# Altium footprint library Components.PcbLib: 260 footprints (part 15 of 17)
Each footprint in its own frame and in the unit in brackets; x right, y up, seen from the top. Pads: shape width x height; smd on the part's side, far side on the other; paste and mask are expansions set on the pad; w line width, h text height; cw(c..) or ccw(c..) is an arc to the next point about the centre after c.
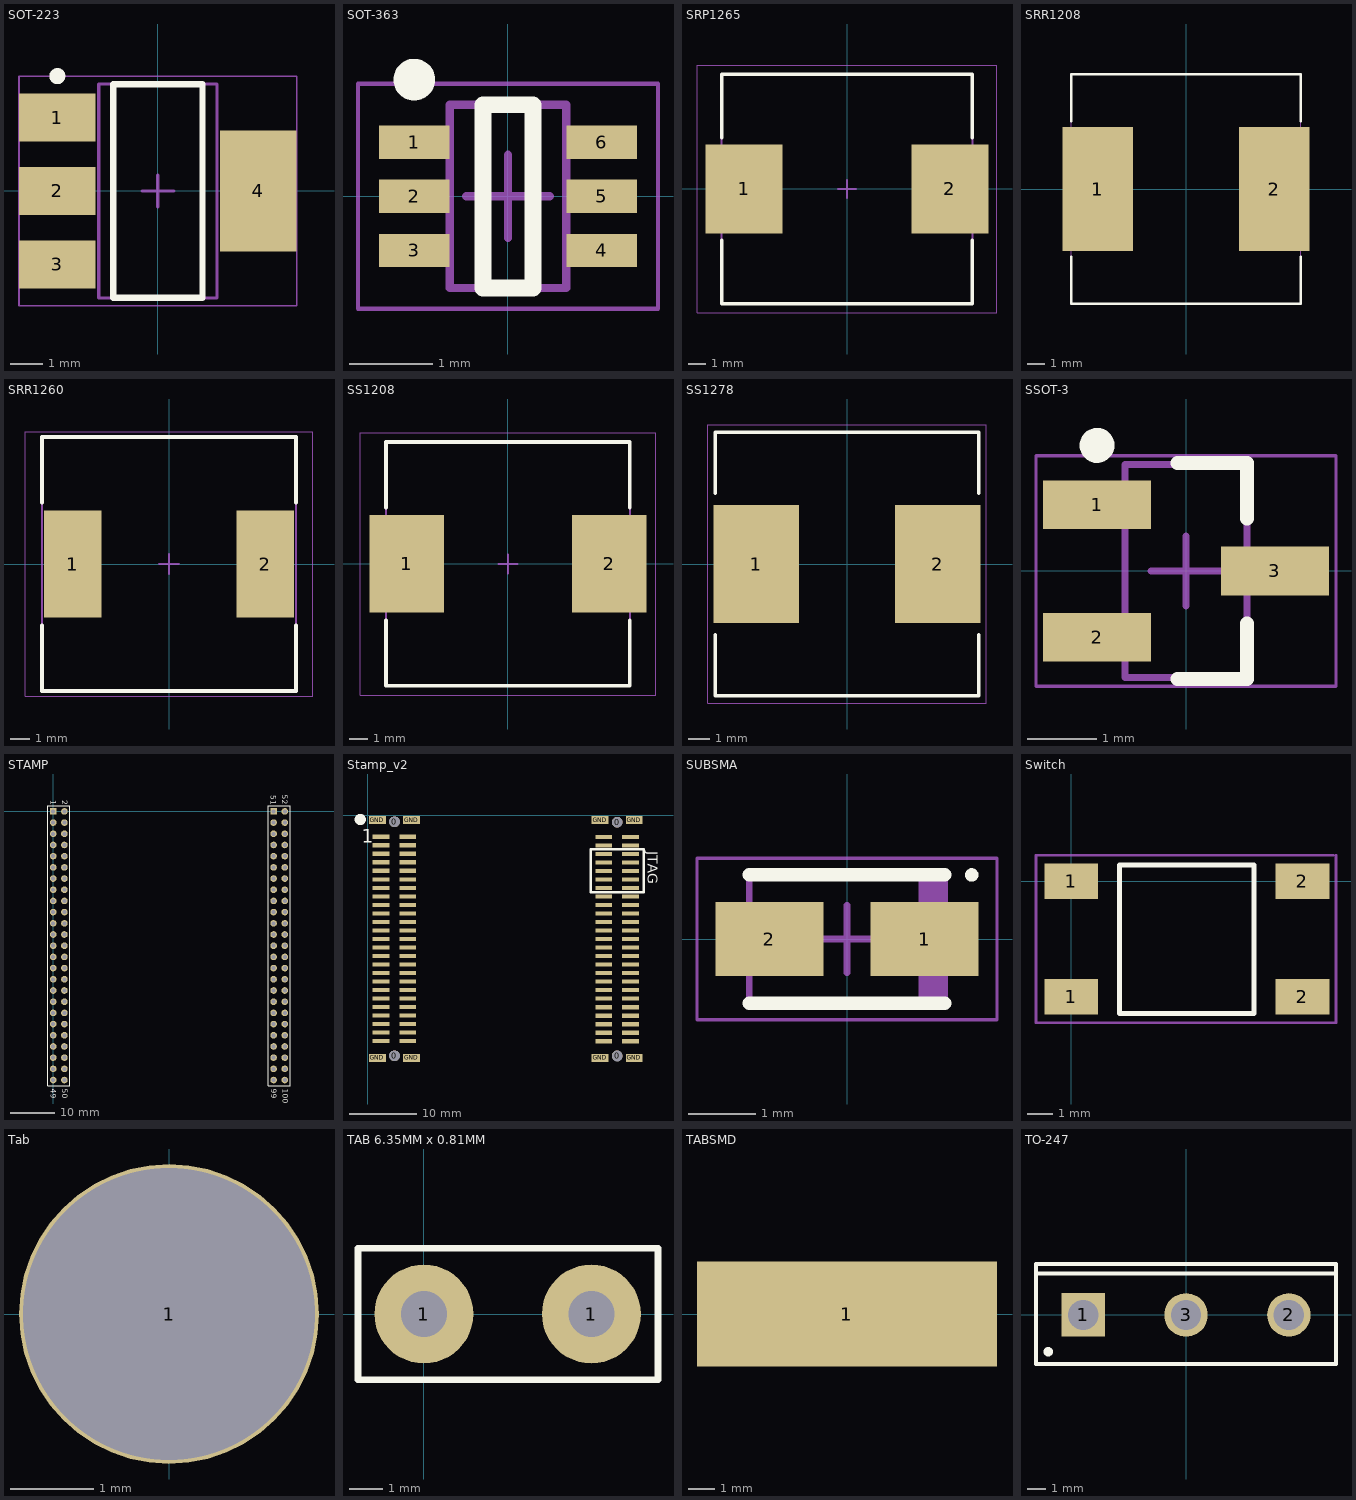
[diagram p14: the footprints below, top view; thin cyan lines are the x and y axes]

## SOT-223 [mm] "SOT223, 4-Leads, Body 6,50x7,00mm (avg), Pitch 2,30mm, IPC Medium Density"
height 1.8
pads (4):
  rect 2.4x1.5 smd: 1(-3.15,2.3) 2(-3.15,0) 3(-3.15,-2.3)
  rect 2.4x3.8 smd: 4(3.15,0)
Top Overlay:
  circle w0.25: c-3.15,3.6 r0.125
  lines w0.2: -1.4,-3.35 -1.4,3.35 1.4,3.35 1.4,-3.35 -1.4,-3.35
Mechanical 13:
  lines w0.1: -1.85,-3.35 -1.85,3.35 1.85,3.35 1.85,-3.35 -1.85,-3.35
Mechanical 15:
  lines w0.05: -4.35,-3.6 -4.35,3.6 4.35,3.6 4.35,-3.6 -4.35,-3.6
  lines w0.1: -0.5,0 0.5,0 ; 0,-0.5 0,0.5
3D body: height 1.8, standoff 0.02, extent -1.85,-3.35 1.85,3.35

## SOT-363 [mm]
height 1.1
pads (6):
  rect 0.85x0.4 smd: 1(-1.125,0.65) 2(-1.125,0) 3(-1.125,-0.65) 4(1.125,-0.65) 5(1.125,0) 6(1.125,0.65)
Top Overlay:
  circle w0.25: c-1.125,1.4 r0.125
  lines w0.2: -0.3,-1.1 -0.3,1.1 0.3,1.1 0.3,-1.1 -0.3,-1.1
Mechanical 13:
  lines w0.1: -0.7,-1.1 -0.7,1.1 0.7,1.1 0.7,-1.1 -0.7,-1.1
Mechanical 15:
  lines w0.05: -1.8,-1.35 -1.8,1.35 1.8,1.35 1.8,-1.35 -1.8,-1.35
  lines w0.1: -0.5,0 0.5,0 ; 0,-0.5 0,0.5
3D body "SOT-363.step": height 1.1, standoff 0, extent -1.2,-1.1 1.2,1.1

## SRP1265 [mm] "Precision Wire Wound Inductor, 2-Leads, Body 13,50x12,50mm, IPC Low Density"
height 6.4
pads (2):
  rect 4.3x4.95 smd: 1(-5.75,0) 2(5.75,0)
Top Overlay:
  lines w0.2: -7,-2.875 -7,-6.4 7,-6.4 7,-2.875 ; -7,2.875 -7,6.4 7,6.4 7,2.875
Mechanical 13:
  lines w0.1: -7,-6.4 7,-6.4 7,6.4 -7,6.4 -7,-6.4
Mechanical 15:
  lines w0.05: -8.375,-6.9 8.375,-6.9 8.375,6.9 -8.375,6.9 -8.375,-6.9
  lines w0.1: -0.5,0 0.5,0 ; 0,-0.5 0,0.5
3D body "L_1265.STEP": height 6.7, standoff 0, extent -6.275,-6.25 6.225,6.25

## SRR1208 [mil]
pads (2):
  rect 157x276 smd: 1(-196.5,0) 2(196.5,0)
Top Overlay:
  lines w6: -256,-151.1 -256,-256 256,-256 256,-151.1 ; -256,151.1 -256,256 256,256 256,151.1
Mechanical 13:
  lines w0: -256,-256 -256,256 256,256 256,-256 -256,-256
3D body "SRR1208.STEP": height 314.96, standoff 0, extent -250,-249.99 250,250.01

## SRR1260 [mm] "Precision Wire Wound Inductor, 2-Leads, Body 12,50x12,50mm, IPC Medium Density"
height 6.5
pads (2):
  rect 2.9x5.4 smd: 1(-4.85,0) 2(4.85,0)
Top Overlay:
  lines w0.2: -6.4,-3.1 -6.4,-6.4 6.4,-6.4 6.4,-3.1 ; -6.4,3.1 -6.4,6.4 6.4,6.4 6.4,3.1
Mechanical 13:
  lines w0.1: -6.4,-6.4 6.4,-6.4 6.4,6.4 -6.4,6.4 -6.4,-6.4
Mechanical 15:
  lines w0.05: -7.225,-6.65 7.225,-6.65 7.225,6.65 -7.225,6.65 -7.225,-6.65
  lines w0.1: -0.5,0 0.5,0 ; 0,-0.5 0,0.5
3D body: height 6.5, standoff 0, extent -6.4,-6.4 6.4,6.4

## SS1208 [mm]
height 8.5
pads (2):
  rect 4x5.2 smd: 1(-5.4,0) 2(5.4,0)
Top Overlay:
  lines w0.2: -6.5,-3 -6.5,-6.5 6.5,-6.5 6.5,-3 ; -6.5,3 -6.5,6.5 6.5,6.5 6.5,3
Mechanical 13:
  lines w0.1: -6.5,-6.5 6.5,-6.5 6.5,6.5 -6.5,6.5 -6.5,-6.5
Mechanical 15:
  lines w0.05: -7.875,-7 7.875,-7 7.875,7 -7.875,7 -7.875,-7
  lines w0.1: -0.5,0 0.5,0 ; 0,-0.5 0,0.5
3D body "SS1208.step": height 8.5, standoff 0.01, extent -6.35,-6.35 6.35,6.35

## SS1278 [mil]
pads (2):
  rect 157x217 smd: 1(-167,0) 2(167,0)
Top Overlay:
  lines w6: -242,-130 -242,-242 242,-242 242,-130 ; -242,130 -242,242 242,242 242,130
Mechanical 13:
  lines w0: -256,-256 256,-256 256,256 -256,256 -256,-256
3D body "SS1278.STEP": height 314.96, standoff 0, extent -242.12,-242.12 242.13,242.13

## SSOT-3 [mm] "SOT23, 3-Leads, Body 2,90x3,60mm, Pitch 0,95mm, IPC High Density"
height 1.45
pads (3):
  rect 1.55x0.7 smd: 1(-1.275,0.95) 2(-1.275,-0.95) 3(1.275,0)
Top Overlay:
  circle w0.25: c-1.275,1.8 r0.125
  lines w0.2: -0.125,-1.55 0.875,-1.55 0.875,-0.75 ; -0.125,1.55 0.875,1.55 0.875,0.75
Mechanical 13:
  lines w0.1: -0.875,-1.525 -0.875,1.525 0.875,1.525 0.875,-1.525 -0.875,-1.525
Mechanical 15:
  lines w0.05: -2.15,-1.65 -2.15,1.65 2.15,1.65 2.15,-1.65 -2.15,-1.65
  lines w0.1: -0.5,0 0.5,0 ; 0,-0.5 0,0.5
3D body "SOT23.STEP": height 1.2, standoff -0.02, extent -1.126,-1.5 1.126,1.5

## STAMP [mm] "2x 2x25 pin, 2.54mm connector"
height 15
pads (100):
  rect 1.5x1.5 hole 0.9: 1(0,0) 51(50.013,0)
  round 1.5 hole 0.9: 2(2.54,0) 3(0,-2.54) 4(2.54,-2.54) 5(0,-5.08) 6(2.54,-5.08) 7(0,-7.62) 8(2.54,-7.62) 9(0,-10.16) 10(2.54,-10.16) 11(0,-12.7) 12(2.54,-12.7) 13(0,-15.24) 14(2.54,-15.24) 15(0,-17.78) 16(2.54,-17.78) 17(0,-20.32) 18(2.54,-20.32) 19(0,-22.86) 20(2.54,-22.86) 21(0,-25.4) 22(2.54,-25.4) 23(0,-27.94) 24(2.54,-27.94) 25(0,-30.48) 26(2.54,-30.48) 27(0,-33.02) 28(2.54,-33.02) 29(0,-35.56) 30(2.54,-35.56) 31(0,-38.1) 32(2.54,-38.1) 33(0,-40.64) 34(2.54,-40.64) 35(0,-43.18) 36(2.54,-43.18) 37(0,-45.72) 38(2.54,-45.72) 39(0,-48.26) 40(2.54,-48.26) 41(0,-50.8) 42(2.54,-50.8) 43(0,-53.34) 44(2.54,-53.34) 45(0,-55.88) 46(2.54,-55.88) 47(0,-58.42) 48(2.54,-58.42) 49(0,-60.96) 50(2.54,-60.96) 52(52.553,0) 53(50.013,-2.54) 54(52.553,-2.54) 55(50.013,-5.08) 56(52.553,-5.08) 57(50.013,-7.62) 58(52.553,-7.62) 59(50.013,-10.16) 60(52.553,-10.16) 61(50.013,-12.7) 62(52.553,-12.7) 63(50.013,-15.24) 64(52.553,-15.24) 65(50.013,-17.78) 66(52.553,-17.78) 67(50.013,-20.32) 68(52.553,-20.32) 69(50.013,-22.86) 70(52.553,-22.86) 71(50.013,-25.4) 72(52.553,-25.4) 73(50.013,-27.94) 74(52.553,-27.94) 75(50.013,-30.48) 76(52.553,-30.48) 77(50.013,-33.02) 78(52.553,-33.02) 79(50.013,-35.56) 80(52.553,-35.56) 81(50.013,-38.1) 82(52.553,-38.1) 83(50.013,-40.64) 84(52.553,-40.64) 85(50.013,-43.18) 86(52.553,-43.18) 87(50.013,-45.72) 88(52.553,-45.72) 89(50.013,-48.26) 90(52.553,-48.26) 91(50.013,-50.8) 92(52.553,-50.8) 93(50.013,-53.34) 94(52.553,-53.34) 95(50.013,-55.88) 96(52.553,-55.88) 97(50.013,-58.42) 98(52.553,-58.42) 99(50.013,-60.96) 100(52.553,-60.96)
Top Overlay:
  lines w0.2: -1.27,-62.23 3.81,-62.23 3.81,1.27 -1.27,1.27 -1.27,-62.23 ; 48.743,-62.23 48.743,1.27 53.823,1.27 53.823,-62.23 48.743,-62.23
  text "2" at 2.032,2.54 h1.27
  text "1" at -0.508,2.54 h1.27
  text "49" at -0.508,-62.992 h1.27
  text "50" at 2.032,-62.992 h1.27
  text "100" at 52.045,-62.992 h1.27
  text "99" at 49.505,-62.992 h1.27
  text "51" at 49.352,3.632 h1.27
  text "52" at 51.994,3.81 h1.27
3D body "BERG-HEADER-2x10.STEP": height 8.4, standoff -3.2, extent -1.27,-49.768 3.73,-23.868
3D body "Stamp_TI.step": height 14.55, standoff 6.17, extent -1.625,-62.657 54.255,1.757
3D body "BERG-HEADER-2x10.STEP": height 8.4, standoff -3.2, extent -1.27,-24.376 3.73,1.524
3D body "BERG-HEADER-2x10.STEP": height 8.4, standoff -3.2, extent 48.743,-49.768 53.743,-23.868
3D body "BERG-HEADER-2x10.STEP": height 8.4, standoff -3.2, extent 48.743,-24.376 53.743,1.524
3D body "BERG-HEADER-2x10.STEP": height 8.4, standoff -3.2, extent 48.743,-62.468 53.743,-36.568
3D body "BERG-HEADER-2x10.STEP": height 8.4, standoff -3.2, extent -1.27,-62.468 3.73,-36.568
3D body "SW3DPS-HEADER 2_54 VERTICAL 2X-DEFAULT.step": height 13.45, standoff 2.45, extent -1.283,-59.67 3.797,-57.17
3D body "SW3DPS-HEADER 2_54 VERTICAL 2X-DEFAULT.step": height 13.45, standoff 2.45, extent -1.283,-57.13 3.797,-54.63
3D body "SW3DPS-HEADER 2_54 VERTICAL 2X-DEFAULT.step": height 13.45, standoff 2.45, extent -1.283,-54.59 3.797,-52.09
3D body "SW3DPS-HEADER 2_54 VERTICAL 2X-DEFAULT.step": height 13.45, standoff 2.45, extent -1.283,-52.05 3.797,-49.55
3D body "SW3DPS-HEADER 2_54 VERTICAL 2X-DEFAULT.step": height 13.45, standoff 2.45, extent -1.283,-49.51 3.797,-47.01
3D body "SW3DPS-HEADER 2_54 VERTICAL 2X-DEFAULT.step": height 13.45, standoff 2.45, extent -1.283,-36.81 3.797,-34.31
3D body "SW3DPS-HEADER 2_54 VERTICAL 2X-DEFAULT.step": height 13.45, standoff 2.45, extent -1.283,-39.35 3.797,-36.85
3D body "SW3DPS-HEADER 2_54 VERTICAL 2X-DEFAULT.step": height 13.45, standoff 2.45, extent -1.283,-41.89 3.797,-39.39
3D body "SW3DPS-HEADER 2_54 VERTICAL 2X-DEFAULT.step": height 13.45, standoff 2.45, extent -1.283,-44.43 3.797,-41.93
3D body "SW3DPS-HEADER 2_54 VERTICAL 2X-DEFAULT.step": height 13.45, standoff 2.45, extent -1.283,-46.97 3.797,-44.47
3D body "SW3DPS-HEADER 2_54 VERTICAL 2X-DEFAULT.step": height 13.45, standoff 2.45, extent -1.283,-24.11 3.797,-21.61
3D body "SW3DPS-HEADER 2_54 VERTICAL 2X-DEFAULT.step": height 13.45, standoff 2.45, extent -1.283,-26.65 3.797,-24.15
3D body "SW3DPS-HEADER 2_54 VERTICAL 2X-DEFAULT.step": height 13.45, standoff 2.45, extent -1.283,-29.19 3.797,-26.69
3D body "SW3DPS-HEADER 2_54 VERTICAL 2X-DEFAULT.step": height 13.45, standoff 2.45, extent -1.283,-31.73 3.797,-29.23
3D body "SW3DPS-HEADER 2_54 VERTICAL 2X-DEFAULT.step": height 13.45, standoff 2.45, extent -1.283,-34.27 3.797,-31.77
3D body "SW3DPS-HEADER 2_54 VERTICAL 2X-DEFAULT.step": height 13.45, standoff 2.45, extent -1.283,-11.41 3.797,-8.91
3D body "SW3DPS-HEADER 2_54 VERTICAL 2X-DEFAULT.step": height 13.45, standoff 2.45, extent -1.283,-13.95 3.797,-11.45
3D body "SW3DPS-HEADER 2_54 VERTICAL 2X-DEFAULT.step": height 13.45, standoff 2.45, extent -1.283,-16.49 3.797,-13.99
3D body "SW3DPS-HEADER 2_54 VERTICAL 2X-DEFAULT.step": height 13.45, standoff 2.45, extent -1.283,-19.03 3.797,-16.53
3D body "SW3DPS-HEADER 2_54 VERTICAL 2X-DEFAULT.step": height 13.45, standoff 2.45, extent -1.283,-21.57 3.797,-19.07
3D body "SW3DPS-HEADER 2_54 VERTICAL 2X-DEFAULT.step": height 13.45, standoff 2.45, extent -1.283,-1.25 3.797,1.25
3D body "SW3DPS-HEADER 2_54 VERTICAL 2X-DEFAULT.step": height 13.45, standoff 2.45, extent -1.283,-3.79 3.797,-1.29
3D body "SW3DPS-HEADER 2_54 VERTICAL 2X-DEFAULT.step": height 13.45, standoff 2.45, extent -1.283,-6.33 3.797,-3.83
3D body "SW3DPS-HEADER 2_54 VERTICAL 2X-DEFAULT.step": height 13.45, standoff 2.45, extent -1.283,-8.87 3.797,-6.37
3D body "SW3DPS-HEADER 2_54 VERTICAL 2X-DEFAULT.step": height 13.45, standoff 2.45, extent -1.283,-62.21 3.797,-59.71
3D body "SW3DPS-HEADER 2_54 VERTICAL 2X-DEFAULT.step": height 13.45, standoff 2.45, extent 48.729,-62.21 53.809,-59.71
3D body "SW3DPS-HEADER 2_54 VERTICAL 2X-DEFAULT.step": height 13.45, standoff 2.45, extent 48.729,-8.87 53.809,-6.37
3D body "SW3DPS-HEADER 2_54 VERTICAL 2X-DEFAULT.step": height 13.45, standoff 2.45, extent 48.729,-6.33 53.809,-3.83
3D body "SW3DPS-HEADER 2_54 VERTICAL 2X-DEFAULT.step": height 13.45, standoff 2.45, extent 48.729,-3.79 53.809,-1.29
3D body "SW3DPS-HEADER 2_54 VERTICAL 2X-DEFAULT.step": height 13.45, standoff 2.45, extent 48.729,-1.25 53.809,1.25
3D body "SW3DPS-HEADER 2_54 VERTICAL 2X-DEFAULT.step": height 13.45, standoff 2.45, extent 48.729,-21.57 53.809,-19.07
3D body "SW3DPS-HEADER 2_54 VERTICAL 2X-DEFAULT.step": height 13.45, standoff 2.45, extent 48.729,-19.03 53.809,-16.53
3D body "SW3DPS-HEADER 2_54 VERTICAL 2X-DEFAULT.step": height 13.45, standoff 2.45, extent 48.729,-16.49 53.809,-13.99
3D body "SW3DPS-HEADER 2_54 VERTICAL 2X-DEFAULT.step": height 13.45, standoff 2.45, extent 48.729,-13.95 53.809,-11.45
3D body "SW3DPS-HEADER 2_54 VERTICAL 2X-DEFAULT.step": height 13.45, standoff 2.45, extent 48.729,-11.41 53.809,-8.91
3D body "SW3DPS-HEADER 2_54 VERTICAL 2X-DEFAULT.step": height 13.45, standoff 2.45, extent 48.729,-34.27 53.809,-31.77
3D body "SW3DPS-HEADER 2_54 VERTICAL 2X-DEFAULT.step": height 13.45, standoff 2.45, extent 48.729,-31.73 53.809,-29.23
3D body "SW3DPS-HEADER 2_54 VERTICAL 2X-DEFAULT.step": height 13.45, standoff 2.45, extent 48.729,-29.19 53.809,-26.69
3D body "SW3DPS-HEADER 2_54 VERTICAL 2X-DEFAULT.step": height 13.45, standoff 2.45, extent 48.729,-26.65 53.809,-24.15
3D body "SW3DPS-HEADER 2_54 VERTICAL 2X-DEFAULT.step": height 13.45, standoff 2.45, extent 48.729,-24.11 53.809,-21.61
3D body "SW3DPS-HEADER 2_54 VERTICAL 2X-DEFAULT.step": height 13.45, standoff 2.45, extent 48.729,-46.97 53.809,-44.47
3D body "SW3DPS-HEADER 2_54 VERTICAL 2X-DEFAULT.step": height 13.45, standoff 2.45, extent 48.729,-44.43 53.809,-41.93
3D body "SW3DPS-HEADER 2_54 VERTICAL 2X-DEFAULT.step": height 13.45, standoff 2.45, extent 48.729,-41.89 53.809,-39.39
3D body "SW3DPS-HEADER 2_54 VERTICAL 2X-DEFAULT.step": height 13.45, standoff 2.45, extent 48.729,-39.35 53.809,-36.85
3D body "SW3DPS-HEADER 2_54 VERTICAL 2X-DEFAULT.step": height 13.45, standoff 2.45, extent 48.729,-36.81 53.809,-34.31
3D body "SW3DPS-HEADER 2_54 VERTICAL 2X-DEFAULT.step": height 13.45, standoff 2.45, extent 48.729,-49.51 53.809,-47.01
3D body "SW3DPS-HEADER 2_54 VERTICAL 2X-DEFAULT.step": height 13.45, standoff 2.45, extent 48.729,-52.05 53.809,-49.55
3D body "SW3DPS-HEADER 2_54 VERTICAL 2X-DEFAULT.step": height 13.45, standoff 2.45, extent 48.729,-54.59 53.809,-52.09
3D body "SW3DPS-HEADER 2_54 VERTICAL 2X-DEFAULT.step": height 13.45, standoff 2.45, extent 48.729,-57.13 53.809,-54.63
3D body "SW3DPS-HEADER 2_54 VERTICAL 2X-DEFAULT.step": height 13.45, standoff 2.45, extent 48.729,-59.67 53.809,-57.17

## Stamp_v2 [mm]
pads (112):
  round 1.6 hole 1.6 unplated: 0(4,-35.94) 0(4,-1) 0(37.25,-35.95) 0(37.25,-1.05)
  rect 2.5x0.65 smd: 1(2,-3.25) 2(6,-3.25) 3(2,-4.52) 4(6,-4.52) 5(2,-5.79) 6(6,-5.79) 7(2,-7.06) 8(6,-7.06) 9(2,-8.33) 10(6,-8.33) 11(2,-9.6) 12(6,-9.6) 13(2,-10.87) 14(6,-10.87) 15(2,-12.14) 16(6,-12.14) 17(2,-13.41) 18(6,-13.41) 19(2,-14.68) 20(6,-14.68) 21(2,-15.95) 22(6,-15.95) 23(2,-17.22) 24(6,-17.22) 25(2,-18.49) 26(6,-18.49) 27(2,-19.76) 28(6,-19.76) 29(2,-21.03) 30(6,-21.03) 31(2,-22.3) 32(6,-22.3) 33(2,-23.57) 34(6,-23.57) 35(2,-24.84) 36(6,-24.84) 37(2,-26.11) 38(6,-26.11) 39(2,-27.38) 40(6,-27.38) 41(2,-28.65) 42(6,-28.65) 43(2,-29.92) 44(6,-29.92) 45(2,-31.19) 46(6,-31.19) 47(2,-32.46) 48(6,-32.46) 49(2,-33.73) 50(6,-33.73) 51(35.25,-3.26) 52(39.25,-3.26) 53(35.25,-4.53) 54(39.25,-4.53) 55(35.25,-5.8) 56(39.25,-5.8) 57(35.25,-7.07) 58(39.25,-7.07) 59(35.25,-8.34) 60(39.25,-8.34) 61(35.25,-9.61) 62(39.25,-9.61) 63(35.25,-10.88) 64(39.25,-10.88) 65(35.25,-12.15) 66(39.25,-12.15) 67(35.25,-13.42) 68(39.25,-13.42) 69(35.25,-14.69) 70(39.25,-14.69) 71(35.25,-15.96) 72(39.25,-15.96) 73(35.25,-17.23) 74(39.25,-17.23) 75(35.25,-18.5) 76(39.25,-18.5) 77(35.25,-19.77) 78(39.25,-19.77) 79(35.25,-21.04) 80(39.25,-21.04) 81(35.25,-22.31) 82(39.25,-22.31) 83(35.25,-23.58) 84(39.25,-23.58) 85(35.25,-24.85) 86(39.25,-24.85) 87(35.25,-26.12) 88(39.25,-26.12) 89(35.25,-27.39) 90(39.25,-27.39) 91(35.25,-28.66) 92(39.25,-28.66) 93(35.25,-29.93) 94(39.25,-29.93) 95(35.25,-31.2) 96(39.25,-31.2) 97(35.25,-32.47) 98(39.25,-32.47) 99(35.25,-33.74) 100(39.25,-33.74)
  rect 2.5x1.2 smd: GND(1.45,-36.24) GND(1.45,-0.74) GND(6.55,-36.24) GND(6.55,-0.74) GND(34.7,-36.25) GND(34.7,-0.75) GND(39.8,-36.25) GND(39.8,-0.75)
Top Overlay:
  circle w1: c-1.11,-0.65 r0.335
  lines w0.4: 33.325,-11.5 33.325,-5.1 41.225,-5.1 41.225,-11.5 33.325,-11.5
  text "JTAG" at 41.85,-5.375 h1.5
  text "1" at -0.9,-4.1 h2
3D body "stamp_full.step": height 13.49, standoff -0.7, extent 0,-36.962 41.25,0

## SUBSMA [mm]
height 1.43
pads (2):
  rect 1.6x1.1 smd: 1(1.15,0) 2(-1.15,0)
Top Overlay:
  circle w0.1: c1.85,0.95 r0.05
  lines w0.2: -1.45,-0.95 1.45,-0.95 ; -1.45,0.95 1.45,0.95
Mechanical 13:
  rectangle: 1.06,-0.95 1.45,0.95
  lines w0.1: -1.45,-0.95 -1.45,0.95 1.45,0.95 1.45,-0.95 -1.45,-0.95
Mechanical 15:
  lines w0.05: -2.225,-1.2 -2.225,1.2 2.225,1.2 2.225,-1.2 -2.225,-1.2
  lines w0.1: -0.5,0 0.5,0 ; 0,-0.5 0,0.5
3D body "SMA_SUB.STEP": height 1.35, standoff 0, extent -1.85,-0.9 1.85,0.9

## Switch [mm]
pads (4):
  rect 2.1x1.4 smd: 1(0,-4.5) 1(0,0) 2(9,-4.5) 2(9,0)
Top Overlay:
  lines w0.2: 1.885,-5.156 1.885,0.635 7.115,0.635 7.115,-5.156 1.885,-5.156
Mechanical 15:
  lines w0.1: -1.372,-5.512 -1.372,1.016 10.211,1.016 ; -1.321,-5.512 10.312,-5.512 10.312,1.016
3D body "SWITCH.step": height 5, standoff 0, extent 0.025,-5.25 9.025,0.75

## Tab [mm]
pads (1):
  round 3.6 hole 3.5: 1(0,0)

## TAB 6.35MM x 0.81MM [mm]
pads (2):
  round 3 hole 1.4: 1(0,0) 1(5.08,0)
Top Overlay:
  lines w0.2: -2,-2 7.1,-2 7.1,2 -2,2 -2,-2
3D body "c-1217861-1-g-3d.stp": height 10.53, standoff -3.49, extent -1.422,-1.543 6.503,1.543

## TABSMD [mm]
pads (1):
  rect 11.4x4 smd: 1(-7.6,0)

## TO-247 [mm] "SIP with Mounting Hole; 3 Leads; Body 20 x 15.6 x 5 mm (typ); Pitch 5.45 mm"
height 24.6
pads (3):
  rect 2.3x2.3 hole 1.6: 1(-5.45,0)
  round 2.3 hole 1.6: 2(5.45,0) 3(0,0)
Top Overlay:
  circle w0.25: c-7.3,-1.95 r0.125
  lines w0.2: -7.95,2.2 7.95,2.2 ; -7.95,-2.6 -7.95,2.7 7.95,2.7 7.95,-2.6 -7.95,-2.6
Mechanical 13:
  lines w0.1: -7.95,-2.6 -7.95,2.7 7.95,2.7 7.95,-2.6 -7.95,-2.6
Mechanical 15:
  lines w0.1: -0.5,0 0.5,0 ; 0,-0.5 0,0.5
3D body: height 24.6, standoff 3.7, extent -7.949,-2.599 7.949,2.699